# Altium footprint library TIDA_00620.PcbLib: 53 footprints (part 3 of 4)
Each footprint in its own frame and in the unit in brackets; x right, y up, seen from the top. Pads: shape width x height; smd on the part's side, far side on the other; paste and mask are expansions set on the pad; w line width, h text height; cw(c..) or ccw(c..) is an arc to the next point about the centre after c.
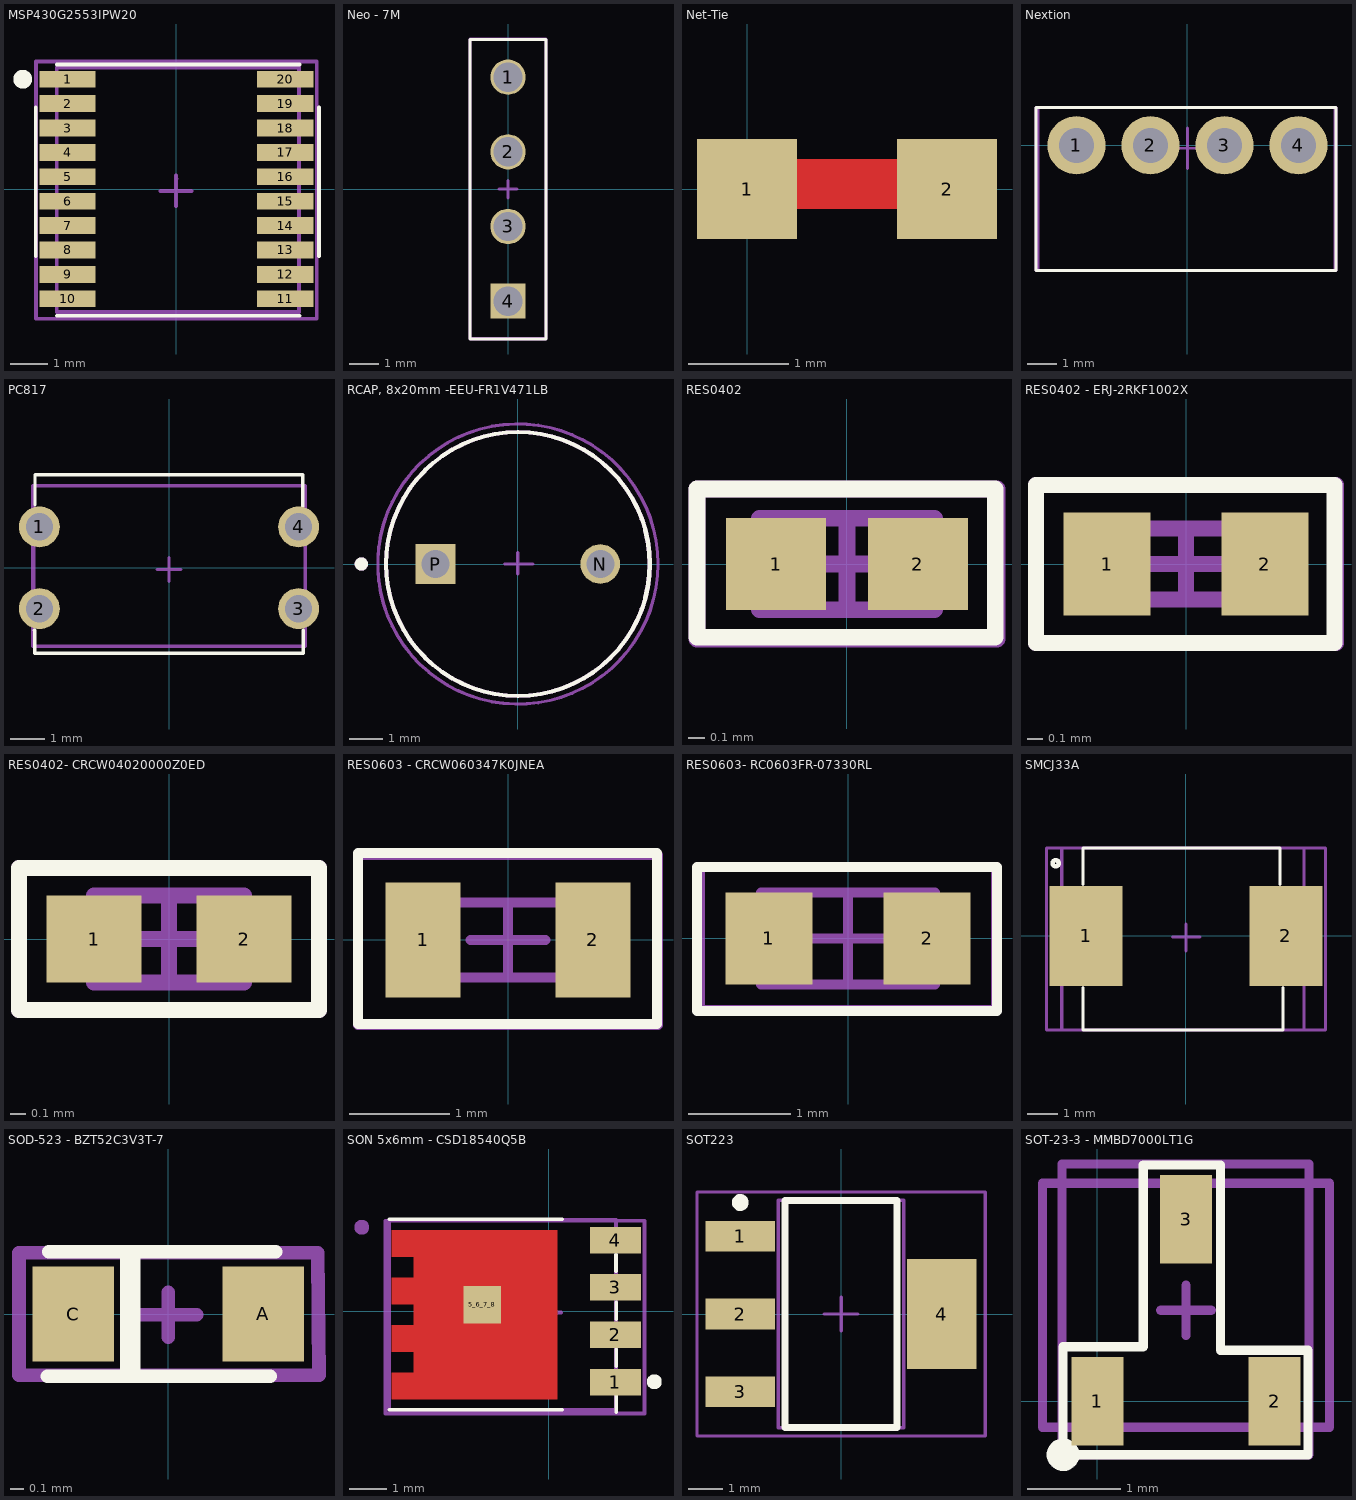
[diagram p2: the footprints below, top view; thin cyan lines are the x and y axes]

## MSP430G2553IPW20 [mm] "SOP, 16-Leads, Body 10,30x7,50mm, Pitch 1,27mm, IPC Medium Density"
height 2.65
pads (20):
  rect 1.5x0.45 smd mask+0.05: 1(-2.9,2.925) 2(-2.9,2.275) 3(-2.9,1.625) 4(-2.9,0.975) 5(-2.9,0.325) 6(-2.9,-0.325) 7(-2.9,-0.975) 8(-2.9,-1.625) 9(-2.9,-2.275) 10(-2.9,-2.925) 11(2.9,-2.925) 12(2.9,-2.275) 13(2.9,-1.625) 14(2.9,-0.975) 15(2.9,-0.325) 16(2.9,0.325) 17(2.9,0.975) 18(2.9,1.625) 19(2.9,2.275) 20(2.9,2.925)
Top Overlay:
  circle w0.3: c-4.093,2.925 r0.1
  lines w0.1: -3.75,-1.79 -3.75,2.17 ; -3.18,-3.38 3.28,-3.38 ; -3.18,3.32 3.28,3.32 ; 3.8,-1.79 3.8,2.17
Top 3D Body:
  lines w0.1: -3.19,3.23 -3.19,-3.28 3.27,-3.28 3.27,3.23 ; -3.19,3.24 3.27,3.24
Top Component Center:
  lines w0.1: -0.42,-0.05 0.4,-0.05 ; -0.01,-0.46 -0.01,0.36 ; -0.01,0.27 0,0.27 ; -3.75,3.4 3.74,3.4 3.74,-3.46 -3.74,-3.46 -3.74,3.4 -3.75,3.4
Top Designator:
  text ".Designator" at 0.153,-0.542 h0.5
3D body: height 1.3, standoff 1, extent -1.959,2.4 -1.359,3
3D body "MSP430G2553IPW20--3DModel-STEP-56544.STEP": height 1.2, standoff 0, extent -3.17,-3.26 3.23,3.24

## Neo - 7M [mm]
pads (4):
  round 1.2 hole 1 mask+0.05: 1(0,3.81) 2(0,1.27) 3(0,-1.27)
  rect 1.2x1.2 hole 1 mask+0.05: 4(0,-3.81)
Top Overlay:
  lines w0.1: -1.3,-5.1 1.3,-5.1 1.3,5.1 -1.3,5.1 -1.3,-5.1
Top 3D Body:
  lines w0.1: -1.3,-5.09 1.3,-5.09 1.3,5.11 -1.3,5.11 -1.3,-5.09
Top Component Center:
  lines w0.1: -0.3,0 0.3,0 ; 0,-0.3 0,0.3 ; -1.3,-5.1 1.3,-5.1 1.3,5.1 -1.3,5.1 -1.3,-5.1
Top Designator:
  text ".Designator" at -0.199,0.243 h0.5
3D body "BPSC-04.stp": height 6, standoff -5.54, extent -1.27,-5.08 1.27,5.08

## Net-Tie [mm]
pads (2):
  rect 1x1 smd mask+0.05: 1(0,0) 2(2,0)
Top Layer:
  rectangle: 0.2,-0.2 1.8,0.3

## Nextion [mm]
pads (4):
  round 2 hole 1.2 mask+0.05: 1(-3.81,0) 2(-1.27,0) 3(1.27,0) 4(3.81,0)
Top Overlay:
  lines w0.1: -5.2,-4.3 5.1,-4.3 5.1,1.3 -5.2,1.3 -5.2,-4.3
Top 3D Body:
  lines w0.1: -5.13,-4.3 5.07,-4.3 5.07,1.3 -5.13,1.3 -5.13,-4.3
Top Component Center:
  lines w0.1: -0.7,-0.1 0.7,-0.1 ; 0,-0.8 0,0.6 ; -5.2,-4.3 5.1,-4.3 5.1,1.3 -5.1,1.3 -5.2,1.3 -5.2,-4.3
Top Designator:
  text ".Designator" at 2.153,-2.042 h0.5
3D body "1x4 Male Pin Header Angle.STEP": height 4.82, standoff -7.54, extent -5.12,-4.25 5.045,1.25

## PC817 [mm]
pads (4):
  round 1.2 hole 0.8 mask+0.05: 1(-3.8,1.2) 2(-3.8,-1.2) 3(3.8,-1.2) 4(3.8,1.2)
Top Overlay:
  lines w0.1: -3.95,-1.83 -3.94,-1.83 -3.94,-2.51 3.94,-2.51 3.94,-1.83 ; -3.93,1.84 -3.93,2.73 3.92,2.73 3.92,1.81 3.93,1.81
Top 3D Body:
  lines w0.1: -3.972,-2.3 4,-2.3 4,2.4 -3.9,2.4 -3.972,2.4 -3.972,-2.3
Top Component Center:
  lines w0.1: -0.35,-0.05 0.35,-0.05 ; 0,-0.4 0,0.3 ; -4,-2.3 -4,2.4 4,2.4 4,-2.3 -4,-2.3
Top Designator:
  text ".Designator" at 1.253,-0.142 h0.5
3D body "PC817_DIP.step": height 4.3, standoff -2.7, extent -3.94,-2.195 3.94,2.395

## RCAP, 8x20mm -EEU-FR1V471LB [mm] "RCAP, 8x20mm - Panasonic"
pads (2):
  round 1.2 hole 0.85 mask+0.05: N(2.5,0)
  rect 1.2x1.2 hole 0.85 mask+0.05: P(-2.5,0)
Top Overlay:
  circle w0.127: c0,0 r4
  circle w0.2: c-4.75,0 r0.1
Top 3D Body:
  circle w0.127: c0,0 r4
  circle w0.2: c-4.75,0 r0.1
Top Component Center:
  circle w0.1: c0,0 r4.25
  lines w0.1: -0.4,0 0.45,0 ; 0,-0.3 0,0.35
Top Designator:
  text ".Designator" at 1.001,-0.157 h0.5
3D body "step_temp.STEP": height 20, standoff -17, extent -4,-3.989 4,3.989

## RES0402 [mm] "Chip Resistor, 2-Leads, Body 1,00x0,50mm, IPC Medium Density  CRCW040213K3FKED, CRCW04021K00JNED, CRCW04021K00FKED"
height 0.4
pads (2):
  rect 0.6x0.55 smd mask+0.05: 1(-0.425,0) 2(0.425,0)
Top Overlay:
  lines w0.1: -0.9,-0.44 -0.9,0.45 0.89,0.45 0.89,-0.44 -0.9,-0.44
Top 3D Body:
  lines w0.1: -0.525,-0.275 0.525,-0.275 0.525,0.275 -0.525,0.275 -0.525,-0.275
Top Component Center:
  lines w0.1: -0.275,0 0.275,0 ; 0,-0.275 0,0.275 ; -0.9,-0.45 0.9,-0.45 0.9,0.45 -0.9,0.45 -0.9,-0.45
Top Designator:
  text ".Designator" at -0.519,-0.247 h0.5
3D body: height 0.4, standoff 0, extent 0.275,-0.275 0.525,0.275
3D body: height 0.4, standoff 0, extent -0.525,-0.275 -0.275,0.275
3D body: height 0.4, standoff 0, extent -0.275,-0.275 0.275,0.275

## RES0402 - ERJ-2RKF1002X [mm] "Chip Resistor, 2-Leads, Body 1,00x0,50mm, IPC Medium Density"
height 0.4
pads (2):
  rect 0.55x0.65 smd mask+0.05: 1(-0.5,0) 2(0.5,0)
Top Overlay:
  lines w0.1: -0.95,-0.5 -0.95,0.5 0.94,0.5 0.94,-0.5 -0.95,-0.5
Top 3D Body:
  lines w0.1: -0.475,-0.225 0.475,-0.225 0.475,0.225 -0.475,0.225 -0.475,-0.225
Top Component Center:
  lines w0.1: -0.225,0 0.225,0 ; 0,-0.225 0,0.225 ; -0.95,-0.5 0.95,-0.5 0.95,0.5 -0.95,0.5 -0.95,-0.5
Top Designator:
  text ".Designator" at -0.629,-0.227 h0.5
3D body: height 0.4, standoff 0, extent 0.225,-0.225 0.475,0.225
3D body: height 0.4, standoff 0, extent -0.475,-0.225 -0.225,0.225
3D body: height 0.4, standoff 0, extent -0.225,-0.225 0.225,0.225

## RES0402- CRCW04020000Z0ED [mm] "Chip Resistor, 2-Leads, Body 1,00x0,50mm, IPC Medium Density"
height 0.4
pads (2):
  rect 0.6x0.55 smd mask+0.05: 1(-0.475,0) 2(0.475,0)
Top Overlay:
  lines w0.1: -0.95,-0.45 0.948,-0.45 0.95,-0.45 0.95,0.45 -0.95,0.45 -0.95,-0.45
Top 3D Body:
  lines w0.1: -0.475,-0.275 0.475,-0.275 0.475,0.275 -0.475,0.275 -0.475,-0.275
Top Component Center:
  lines w0.1: -0.275,0 0.275,0 ; 0,-0.275 0,0.275 ; -0.95,-0.45 0.95,-0.45 0.95,0.45 -0.95,0.45 -0.95,-0.45
Top Designator:
  text ".Designator" at -0.769,-0.257 h0.5
3D body: height 0.4, standoff 0, extent 0.225,-0.275 0.475,0.275
3D body: height 0.4, standoff 0, extent -0.475,-0.275 -0.225,0.275
3D body: height 0.4, standoff 0, extent -0.225,-0.275 0.225,0.275

## RES0603 - CRCW060347K0JNEA [mm] "Chip Resistor, 2-Leads, Body 1,63x0,85mm, IPC Medium Density CRCW06030000Z0EA"
height 0.5
pads (2):
  rect 0.75x1.15 smd mask+0.05: 1(-0.85,0) 2(0.85,0)
Top Overlay:
  lines w0.1: -1.5,-0.84 -1.5,0.87 1.49,0.87 1.49,-0.84 -1.5,-0.84
Top 3D Body:
  lines w0.1: -0.8,-0.375 -0.8,0.375 0.8,0.375 0.8,-0.375 -0.8,-0.375
Top Component Center:
  lines w0.1: -0.375,0 0.375,0 ; 0,-0.375 0,0.375 ; -1.5,-0.85 -1.5,0.85 1.5,0.85 1.5,-0.85 -1.5,-0.85
Top Designator:
  text ".Designator" at -0.659,-0.197 h0.5
3D body: height 0.5, standoff 0, extent -0.55,-0.375 0.55,0.375
3D body: height 0.5, standoff 0, extent -0.8,-0.375 -0.55,0.375
3D body: height 0.5, standoff 0, extent 0.55,-0.375 0.8,0.375

## RES0603- RC0603FR-07330RL [mm] "Chip Resistor, 2-Leads, Body 1,60x0,80mm, IPC Medium Density"
height 0.55
pads (2):
  rect 0.85x0.9 smd mask+0.05: 1(-0.775,0) 2(0.775,0)
Top Overlay:
  lines w0.1: -1.48,-0.71 -1.48,0.7 1.46,0.7 1.46,-0.71 -1.48,-0.71
Top 3D Body:
  lines w0.1: -0.85,-0.45 -0.85,0.45 0.85,0.45 0.85,-0.45 -0.85,-0.45
Top Component Center:
  lines w0.1: -0.45,0 0.45,0 ; 0,-0.45 0,0.45 ; -1.45,-0.7 -1.45,0.7 1.45,0.7 1.45,-0.7 -1.45,-0.7
Top Designator:
  text ".Designator" at -0.709,-0.167 h0.5
3D body: height 0.55, standoff 0, extent -0.6,-0.45 0.6,0.45
3D body: height 0.55, standoff 0, extent -0.85,-0.45 -0.6,0.45
3D body: height 0.55, standoff 0, extent 0.6,-0.45 0.85,0.45

## SMCJ33A [mm]
pads (2):
  rect 2.4x3.3 smd mask+0.05: 1(-3.3,0) 2(3.3,0)
Top Overlay:
  circle w0.15: c-4.3,2.4 r0.1
  lines w0.1: -3.4,-1.7 -3.4,-3.1 3.2,-3.1 3.2,-1.7 ; -3.4,1.7 -3.4,2.9 3.1,2.9 3.1,1.7
Top 3D Body:
  lines w0.1: -4.1,-3.1 3.9,-3.1 3.9,2.9 -4.1,2.9 -4.1,-3.1
Top Component Center:
  lines w0.1: -0.444,-0.035 0.456,-0.035 ; 0,-0.5 0,0.4 ; -4.6,-3.1 4.6,-3.1 4.6,2.9 -4.1,2.9 -4.6,2.9 -4.6,-3.1
Top Designator:
  text ".Designator" at 0.591,-0.367 h0.5
3D body "SMCJ33A.STEP": height 2.62, standoff 0, extent -4.03,-3.023 3.91,2.883

## SOD-523 - BZT52C3V3T-7 [mm]
pads (2):
  rect 0.6x0.7 smd mask+0.05: A(0.7,0) C(-0.7,0)
Top Overlay:
  lines w0.1: -0.89,-0.46 0.75,-0.46 ; -0.88,0.46 0.79,0.46
  lines w0.15: -0.28,-0.42 -0.28,0.41
Top Component Center:
  lines w0.1: 0,-0.17 0,0.16 ; 0.21,-0.005 0,-0.005 ; 0,-0.005 -0.21,-0.005 0,-0.005 ; -1.1,-0.45 -1.1,0.45 1.1,0.45 1.11,-0.45 -1.1,-0.45
Top Designator:
  text ".Designator" at -0.329,-0.247 h0.5
3D body "BZT52C3V3T-7.STEP": height 0.65, standoff 0, extent -0.8,-0.4 0.8,0.4

## SON 5x6mm - CSD18540Q5B [mm]
pads (5):
  rect 1.372x0.71 smd mask+0.05: 1(1.783,-1.905) 2(1.783,-0.635) 3(1.783,0.635) 4(1.783,1.905)
  rect 1x1 smd paste-1 mask+0: 5_6_7_8(-1.783,0.171)
Top Layer:
  region: -4.21,-1.645 -3.62,-1.645 -3.62,-1.085 -4.21,-1.085 -4.21,-0.375 -3.62,-0.375 -3.62,0.185 -4.21,0.185 -4.21,0.895 -3.62,0.895 -3.62,1.455 -4.21,1.455 -4.21,2.165 0.23,2.165 0.23,-2.355 -4.21,-2.355
Top Overlay:
  circle w0.2: c2.826,-1.893 r0.1
  lines w0.1: -4.27,-2.64 0.36,-2.64 ; -4.27,2.46 0.36,2.46 ; 1.8,1.07 1.8,1.51 ; 1.81,-2.71 1.81,-2.27 ; 1.81,-1.47 1.81,-1.03 ; 1.81,-0.21 1.81,0.23
Top Paste:
  region: -4.136,-1.75 -3.37,-1.75 -3.37,-2.258 -4.136,-2.258
  region: -4.136,-0.48 -3.37,-0.48 -3.37,-0.988 -4.136,-0.988
  region: -4.136,0.79 -3.37,0.79 -3.37,0.282 -4.136,0.282
  region: -4.136,2.06 -3.37,2.06 -3.37,1.552 -4.136,1.552
  region: -3.084,-0.249 -1.79,-0.249 -1.79,-0.995 -3.084,-0.995
  region: -3.084,0.797 -1.79,0.797 -1.79,0.051 -3.084,0.051
  region: -3.084,-1.295 -1.79,-1.295 -1.79,-2.041 -3.084,-2.041
  region: -3.084,1.843 -1.79,1.843 -1.79,1.097 -3.084,1.097
  region: -1.44,1.843 -0.146,1.843 -0.146,1.097 -1.44,1.097
  region: -1.44,0.797 -0.146,0.797 -0.146,0.051 -1.44,0.051
  region: -1.44,-0.249 -0.146,-0.249 -0.146,-0.995 -1.44,-0.995
  region: -1.44,-1.295 -0.146,-1.295 -0.146,-2.041 -1.44,-2.041
Top Solder:
  region: -4.307,-1.535 -3.717,-1.535 -3.717,-1.175 -4.307,-1.175 -4.307,-0.265 -3.717,-0.265 -3.717,0.095 -4.307,0.095 -4.307,1.005 -3.717,1.005 -3.717,1.365 -4.317,1.365 -4.317,2.275 0.333,2.275 0.333,-2.445 -4.307,-2.445
Top 3D Body:
  circle w0.2: c-5.014,2.247 r0.1
  lines w0.1: -4.28,-2.64 -4.28,2.44 1.8,2.44 1.8,-2.64 -4.28,-2.64
Top Component Center:
  lines w0.1: -0.325,-0.035 0.325,-0.035 ; 0,-0.36 0,0.29 ; -4.377,-2.745 -4.377,2.425 2.563,2.425 2.563,-2.745 -4.377,-2.745
Top Designator:
  text ".Designator" at -0.849,-0.347 h0.5
3D body "step_temp.STEP": height 1.05, standoff 0, extent -4.237,-2.595 1.763,2.405

## SOT223 [mm] "SOT223, 4-Leads, Body 6,50x7,00mm (avg), Pitch 2,29mm, IPC Medium Density"
height 1.8
pads (4):
  rect 2.05x0.9 smd: 1(-2.975,2.29) 2(-2.975,0) 3(-2.975,-2.29)
  rect 2.05x3.25 smd: 4(2.975,0)
Top Overlay:
  circle w0.25: c-2.975,3.29 r0.125
  lines w0.2: -1.65,-3.35 1.65,-3.35 1.65,3.35 -1.65,3.35 -1.65,-3.35
Top 3D Body:
  lines w0.1: -1.85,-3.35 1.85,-3.35 1.85,3.35 -1.85,3.35 -1.85,-3.35
Top Component Center:
  lines w0.1: -0.5,0 0.5,0 ; 0,-0.5 0,0.5 ; -4.25,-3.6 4.25,-3.6 4.25,3.6 -4.25,3.6 -4.25,-3.6
3D body: height 1.8, standoff 0.02, extent -1.85,-3.35 1.85,3.35

## SOT-23-3 - MMBD7000LT1G [mm]
pads (3):
  rect 0.56x0.95 smd mask+0.05: 1(0,0) 2(1.9,0) 3(0.95,1.95)
Top Overlay:
  circle w0.15: c-0.37,-0.575 r0.1
  lines w0.1: -0.37,-0.575 -0.37,0.585 0.49,0.585 0.49,2.535 1.32,2.535 1.32,0.545 2.26,0.545 2.26,-0.575 -0.37,-0.575
Top 3D Body:
  lines w0.1: -0.59,-0.28 -0.59,2.34 2.49,2.34 2.49,-0.28 -0.59,-0.28
Top Component Center:
  lines w0.1: 0.68,0.975 1.22,0.975 ; 0.95,0.705 0.95,1.245 ; -0.38,-0.575 -0.38,2.545 0.63,2.545 2.27,2.545 2.27,-0.575 -0.38,-0.575
Top Designator:
  text ".Designator" at 0.153,0.713 h0.5
3D body: height 1.19, standoff 1.1, extent -0.275,0.56 -0.095,0.74
3D body "SOT23-3.step": height 1.1, standoff 0, extent -0.55,-0.21 2.45,2.29